# Altium integrated library Samtec 2 mm Pitch Terminal Strips.IntLib: 623 symbols (part 5 of 5) (continued)
## TW-24-05-L-D-340-110
designator P?
Through-Hole Board Stacker, Vertical, -55 to 125 degC, 2 mm Pitch, 48-Pin, Male, RoHS; Manufacturer: Samtec; PartNumber: TW-24-05-L-D-340-110; Pitch: 2 mm; DatasheetVersion: F-214; PackageVersion: BF, 6/1998; PackageReference: TW-24-05-X-D-340-110; PackageDescription: High Temp 2mm Terminal Strip(Board Stacking); Orientation: Vertical; RoHS: True; Temperature Range: -55 to 125 degC; Mounting Technology: Through-hole; ComponentLink1Description: Manufacturer URL; ComponentLink1URL: http://www.samtec.com; ComponentLink2Description: Datasheet; ComponentLink2URL: http://d2a072wq521u33.cloudfront.net/catalog_english//TW_TH.PDF; ComponentLink3Description: Package Specification; ComponentLink3URL: http://www.samtec.com/documents/webfiles/cpdf/TW-XX-XX-X-X-XXX-XXX-XXX-XX-MKT2.pdf
footprint SMTC-TW-24-05-X-D-340-110 (Terminal Strip, 2x24 Pins, Vertical, 2mm Pitch, Male)
pins: 1, 2, 3, 4, 5, 6, 7, 8, 9, 10, 11, 12, 13, 14, 15, 16, 17, 18, 19, 20, 21, 22, 23, 24, 25, 26, 27, 28, 29, 30, 31, 32, 33, 34, 35, 36, 37, 38, 39, 40, 41, 42, 43, 44, 45, 46, 47, 48

## TW-24-05-L-D-340-115
designator P?
Through-Hole Board Stacker, Vertical, -55 to 125 degC, 2 mm Pitch, 48-Pin, Male, RoHS; Manufacturer: Samtec; PartNumber: TW-24-05-L-D-340-115; Pitch: 2 mm; DatasheetVersion: F-214; PackageVersion: BF, 6/1998; PackageReference: TW-24-05-X-D-340-115; PackageDescription: High Temp 2mm Terminal Strip(Board Stacking); Orientation: Vertical; RoHS: True; Temperature Range: -55 to 125 degC; Mounting Technology: Through-hole; ComponentLink1Description: Manufacturer URL; ComponentLink1URL: http://www.samtec.com; ComponentLink2Description: Datasheet; ComponentLink2URL: http://d2a072wq521u33.cloudfront.net/catalog_english//TW_TH.PDF; ComponentLink3Description: Package Specification; ComponentLink3URL: http://www.samtec.com/documents/webfiles/cpdf/TW-XX-XX-X-X-XXX-XXX-XXX-XX-MKT2.pdf
footprint SMTC-TW-24-05-X-D-340-115 (Terminal Strip, 2x24 Pins, Vertical, 2mm Pitch, Male)
pins: 1, 2, 3, 4, 5, 6, 7, 8, 9, 10, 11, 12, 13, 14, 15, 16, 17, 18, 19, 20, 21, 22, 23, 24, 25, 26, 27, 28, 29, 30, 31, 32, 33, 34, 35, 36, 37, 38, 39, 40, 41, 42, 43, 44, 45, 46, 47, 48

## TW-24-05-T-D-340-110
designator P?
Through-Hole Board Stacker, Vertical, -55 to 105 degC, 2 mm Pitch, 48-Pin, Male, RoHS; Manufacturer: Samtec; PartNumber: TW-24-05-T-D-340-110; Pitch: 2 mm; DatasheetVersion: F-214; PackageVersion: BF, 6/1998; PackageReference: TW-24-05-X-D-340-110; PackageDescription: High Temp 2mm Terminal Strip(Board Stacking); Orientation: Vertical; RoHS: True; Temperature Range: -55 to 105 degC; Mounting Technology: Through-hole; ComponentLink1Description: Manufacturer URL; ComponentLink1URL: http://www.samtec.com; ComponentLink2Description: Datasheet; ComponentLink2URL: http://d2a072wq521u33.cloudfront.net/catalog_english//TW_TH.PDF; ComponentLink3Description: Package Specification; ComponentLink3URL: http://www.samtec.com/documents/webfiles/cpdf/TW-XX-XX-X-X-XXX-XXX-XXX-XX-MKT2.pdf
footprint SMTC-TW-24-05-X-D-340-110 (Terminal Strip, 2x24 Pins, Vertical, 2mm Pitch, Male)
pins: 1, 2, 3, 4, 5, 6, 7, 8, 9, 10, 11, 12, 13, 14, 15, 16, 17, 18, 19, 20, 21, 22, 23, 24, 25, 26, 27, 28, 29, 30, 31, 32, 33, 34, 35, 36, 37, 38, 39, 40, 41, 42, 43, 44, 45, 46, 47, 48

## TW-24-05-T-D-340-115
designator P?
Through-Hole Board Stacker, Vertical, -55 to 105 degC, 2 mm Pitch, 48-Pin, Male, RoHS; Manufacturer: Samtec; PartNumber: TW-24-05-T-D-340-115; Pitch: 2 mm; DatasheetVersion: F-214; PackageVersion: BF, 6/1998; PackageReference: TW-24-05-X-D-340-115; PackageDescription: High Temp 2mm Terminal Strip(Board Stacking); Orientation: Vertical; RoHS: True; Temperature Range: -55 to 105 degC; Mounting Technology: Through-hole; ComponentLink1Description: Manufacturer URL; ComponentLink1URL: http://www.samtec.com; ComponentLink2Description: Datasheet; ComponentLink2URL: http://d2a072wq521u33.cloudfront.net/catalog_english//TW_TH.PDF; ComponentLink3Description: Package Specification; ComponentLink3URL: http://www.samtec.com/documents/webfiles/cpdf/TW-XX-XX-X-X-XXX-XXX-XXX-XX-MKT2.pdf
footprint SMTC-TW-24-05-X-D-340-115 (Terminal Strip, 2x24 Pins, Vertical, 2mm Pitch, Male)
pins: 1, 2, 3, 4, 5, 6, 7, 8, 9, 10, 11, 12, 13, 14, 15, 16, 17, 18, 19, 20, 21, 22, 23, 24, 25, 26, 27, 28, 29, 30, 31, 32, 33, 34, 35, 36, 37, 38, 39, 40, 41, 42, 43, 44, 45, 46, 47, 48

## TW-25-03-F-D-200-170
designator P?
Through-Hole Board Stacker, Vertical, -55 to 125 degC, 2 mm Pitch, 50-Pin, Male, RoHS; Manufacturer: Samtec; PartNumber: TW-25-03-F-D-200-170; Pitch: 2 mm; DatasheetVersion: F-214; PackageVersion: BF, 6/1998; PackageReference: TW-25-03-X-D-200-170; PackageDescription: High Temp 2mm Terminal Strip(Board Stacking); Orientation: Vertical; RoHS: True; Temperature Range: -55 to 125 degC; Mounting Technology: Through-hole; ComponentLink1Description: Manufacturer URL; ComponentLink1URL: http://www.samtec.com; ComponentLink2Description: Datasheet; ComponentLink2URL: http://d2a072wq521u33.cloudfront.net/catalog_english//TW_TH.PDF; ComponentLink3Description: Package Specification; ComponentLink3URL: http://www.samtec.com/documents/webfiles/cpdf/TW-XX-XX-X-X-XXX-XXX-XXX-XX-MKT2.pdf
footprint SMTC-TW-25-03-X-D-200-170 (Terminal Strip, 2x25 Pins, Vertical, 2mm Pitch, Male)
pins: 1, 2, 3, 4, 5, 6, 7, 8, 9, 10, 11, 12, 13, 14, 15, 16, 17, 18, 19, 20, 21, 22, 23, 24, 25, 26, 27, 28, 29, 30, 31, 32, 33, 34, 35, 36, 37, 38, 39, 40, 41, 42, 43, 44, 45, 46, 47, 48, 49, 50

## TW-25-03-F-D-250-150
designator P?
Through-Hole Board Stacker, Vertical, -55 to 125 degC, 2 mm Pitch, 50-Pin, Male, RoHS; Manufacturer: Samtec; PartNumber: TW-25-03-F-D-250-150; Pitch: 2 mm; DatasheetVersion: F-214; PackageVersion: BF, 6/1998; PackageReference: TW-25-03-X-D-250-150; PackageDescription: High Temp 2mm Terminal Strip(Board Stacking); Orientation: Vertical; RoHS: True; Temperature Range: -55 to 125 degC; Mounting Technology: Through-hole; ComponentLink1Description: Manufacturer URL; ComponentLink1URL: http://www.samtec.com; ComponentLink2Description: Datasheet; ComponentLink2URL: http://d2a072wq521u33.cloudfront.net/catalog_english//TW_TH.PDF; ComponentLink3Description: Package Specification; ComponentLink3URL: http://www.samtec.com/documents/webfiles/cpdf/TW-XX-XX-X-X-XXX-XXX-XXX-XX-MKT2.pdf
footprint SMTC-TW-25-03-X-D-250-150 (Terminal Strip, 2x25 Pins, Vertical, 2mm Pitch, Male)
pins: 1, 2, 3, 4, 5, 6, 7, 8, 9, 10, 11, 12, 13, 14, 15, 16, 17, 18, 19, 20, 21, 22, 23, 24, 25, 26, 27, 28, 29, 30, 31, 32, 33, 34, 35, 36, 37, 38, 39, 40, 41, 42, 43, 44, 45, 46, 47, 48, 49, 50

## TW-25-03-L-D-200-170
designator P?
Through-Hole Board Stacker, Vertical, -55 to 125 degC, 2 mm Pitch, 50-Pin, Male, RoHS; Manufacturer: Samtec; PartNumber: TW-25-03-L-D-200-170; Pitch: 2 mm; DatasheetVersion: F-214; PackageVersion: BF, 6/1998; PackageReference: TW-25-03-X-D-200-170; PackageDescription: High Temp 2mm Terminal Strip(Board Stacking); Orientation: Vertical; RoHS: True; Temperature Range: -55 to 125 degC; Mounting Technology: Through-hole; ComponentLink1Description: Manufacturer URL; ComponentLink1URL: http://www.samtec.com; ComponentLink2Description: Datasheet; ComponentLink2URL: http://d2a072wq521u33.cloudfront.net/catalog_english//TW_TH.PDF; ComponentLink3Description: Package Specification; ComponentLink3URL: http://www.samtec.com/documents/webfiles/cpdf/TW-XX-XX-X-X-XXX-XXX-XXX-XX-MKT2.pdf
footprint SMTC-TW-25-03-X-D-200-170 (Terminal Strip, 2x25 Pins, Vertical, 2mm Pitch, Male)
pins: 1, 2, 3, 4, 5, 6, 7, 8, 9, 10, 11, 12, 13, 14, 15, 16, 17, 18, 19, 20, 21, 22, 23, 24, 25, 26, 27, 28, 29, 30, 31, 32, 33, 34, 35, 36, 37, 38, 39, 40, 41, 42, 43, 44, 45, 46, 47, 48, 49, 50

## TW-25-03-L-D-250-150
designator P?
Through-Hole Board Stacker, Vertical, -55 to 125 degC, 2 mm Pitch, 50-Pin, Male, RoHS; Manufacturer: Samtec; PartNumber: TW-25-03-L-D-250-150; Pitch: 2 mm; DatasheetVersion: F-214; PackageVersion: BF, 6/1998; PackageReference: TW-25-03-X-D-250-150; PackageDescription: High Temp 2mm Terminal Strip(Board Stacking); Orientation: Vertical; RoHS: True; Temperature Range: -55 to 125 degC; Mounting Technology: Through-hole; ComponentLink1Description: Manufacturer URL; ComponentLink1URL: http://www.samtec.com; ComponentLink2Description: Datasheet; ComponentLink2URL: http://d2a072wq521u33.cloudfront.net/catalog_english//TW_TH.PDF; ComponentLink3Description: Package Specification; ComponentLink3URL: http://www.samtec.com/documents/webfiles/cpdf/TW-XX-XX-X-X-XXX-XXX-XXX-XX-MKT2.pdf
footprint SMTC-TW-25-03-X-D-250-150 (Terminal Strip, 2x25 Pins, Vertical, 2mm Pitch, Male)
pins: 1, 2, 3, 4, 5, 6, 7, 8, 9, 10, 11, 12, 13, 14, 15, 16, 17, 18, 19, 20, 21, 22, 23, 24, 25, 26, 27, 28, 29, 30, 31, 32, 33, 34, 35, 36, 37, 38, 39, 40, 41, 42, 43, 44, 45, 46, 47, 48, 49, 50

## TW-25-03-T-D-200-170
designator P?
Through-Hole Board Stacker, Vertical, -55 to 105 degC, 2 mm Pitch, 50-Pin, Male, RoHS; Manufacturer: Samtec; PartNumber: TW-25-03-T-D-200-170; Pitch: 2 mm; DatasheetVersion: F-214; PackageVersion: BF, 6/1998; PackageReference: TW-25-03-X-D-200-170; PackageDescription: High Temp 2mm Terminal Strip(Board Stacking); Orientation: Vertical; RoHS: True; Temperature Range: -55 to 105 degC; Mounting Technology: Through-hole; ComponentLink1Description: Manufacturer URL; ComponentLink1URL: http://www.samtec.com; ComponentLink2Description: Datasheet; ComponentLink2URL: http://d2a072wq521u33.cloudfront.net/catalog_english//TW_TH.PDF; ComponentLink3Description: Package Specification; ComponentLink3URL: http://www.samtec.com/documents/webfiles/cpdf/TW-XX-XX-X-X-XXX-XXX-XXX-XX-MKT2.pdf
footprint SMTC-TW-25-03-X-D-200-170 (Terminal Strip, 2x25 Pins, Vertical, 2mm Pitch, Male)
pins: 1, 2, 3, 4, 5, 6, 7, 8, 9, 10, 11, 12, 13, 14, 15, 16, 17, 18, 19, 20, 21, 22, 23, 24, 25, 26, 27, 28, 29, 30, 31, 32, 33, 34, 35, 36, 37, 38, 39, 40, 41, 42, 43, 44, 45, 46, 47, 48, 49, 50

## TW-25-03-T-D-250-150
designator P?
Through-Hole Board Stacker, Vertical, -55 to 105 degC, 2 mm Pitch, 50-Pin, Male, RoHS; Manufacturer: Samtec; PartNumber: TW-25-03-T-D-250-150; Pitch: 2 mm; DatasheetVersion: F-214; PackageVersion: BF, 6/1998; PackageReference: TW-25-03-X-D-250-150; PackageDescription: High Temp 2mm Terminal Strip(Board Stacking); Orientation: Vertical; RoHS: True; Temperature Range: -55 to 105 degC; Mounting Technology: Through-hole; ComponentLink1Description: Manufacturer URL; ComponentLink1URL: http://www.samtec.com; ComponentLink2Description: Datasheet; ComponentLink2URL: http://d2a072wq521u33.cloudfront.net/catalog_english//TW_TH.PDF; ComponentLink3Description: Package Specification; ComponentLink3URL: http://www.samtec.com/documents/webfiles/cpdf/TW-XX-XX-X-X-XXX-XXX-XXX-XX-MKT2.pdf
footprint SMTC-TW-25-03-X-D-250-150 (Terminal Strip, 2x25 Pins, Vertical, 2mm Pitch, Male)
pins: 1, 2, 3, 4, 5, 6, 7, 8, 9, 10, 11, 12, 13, 14, 15, 16, 17, 18, 19, 20, 21, 22, 23, 24, 25, 26, 27, 28, 29, 30, 31, 32, 33, 34, 35, 36, 37, 38, 39, 40, 41, 42, 43, 44, 45, 46, 47, 48, 49, 50

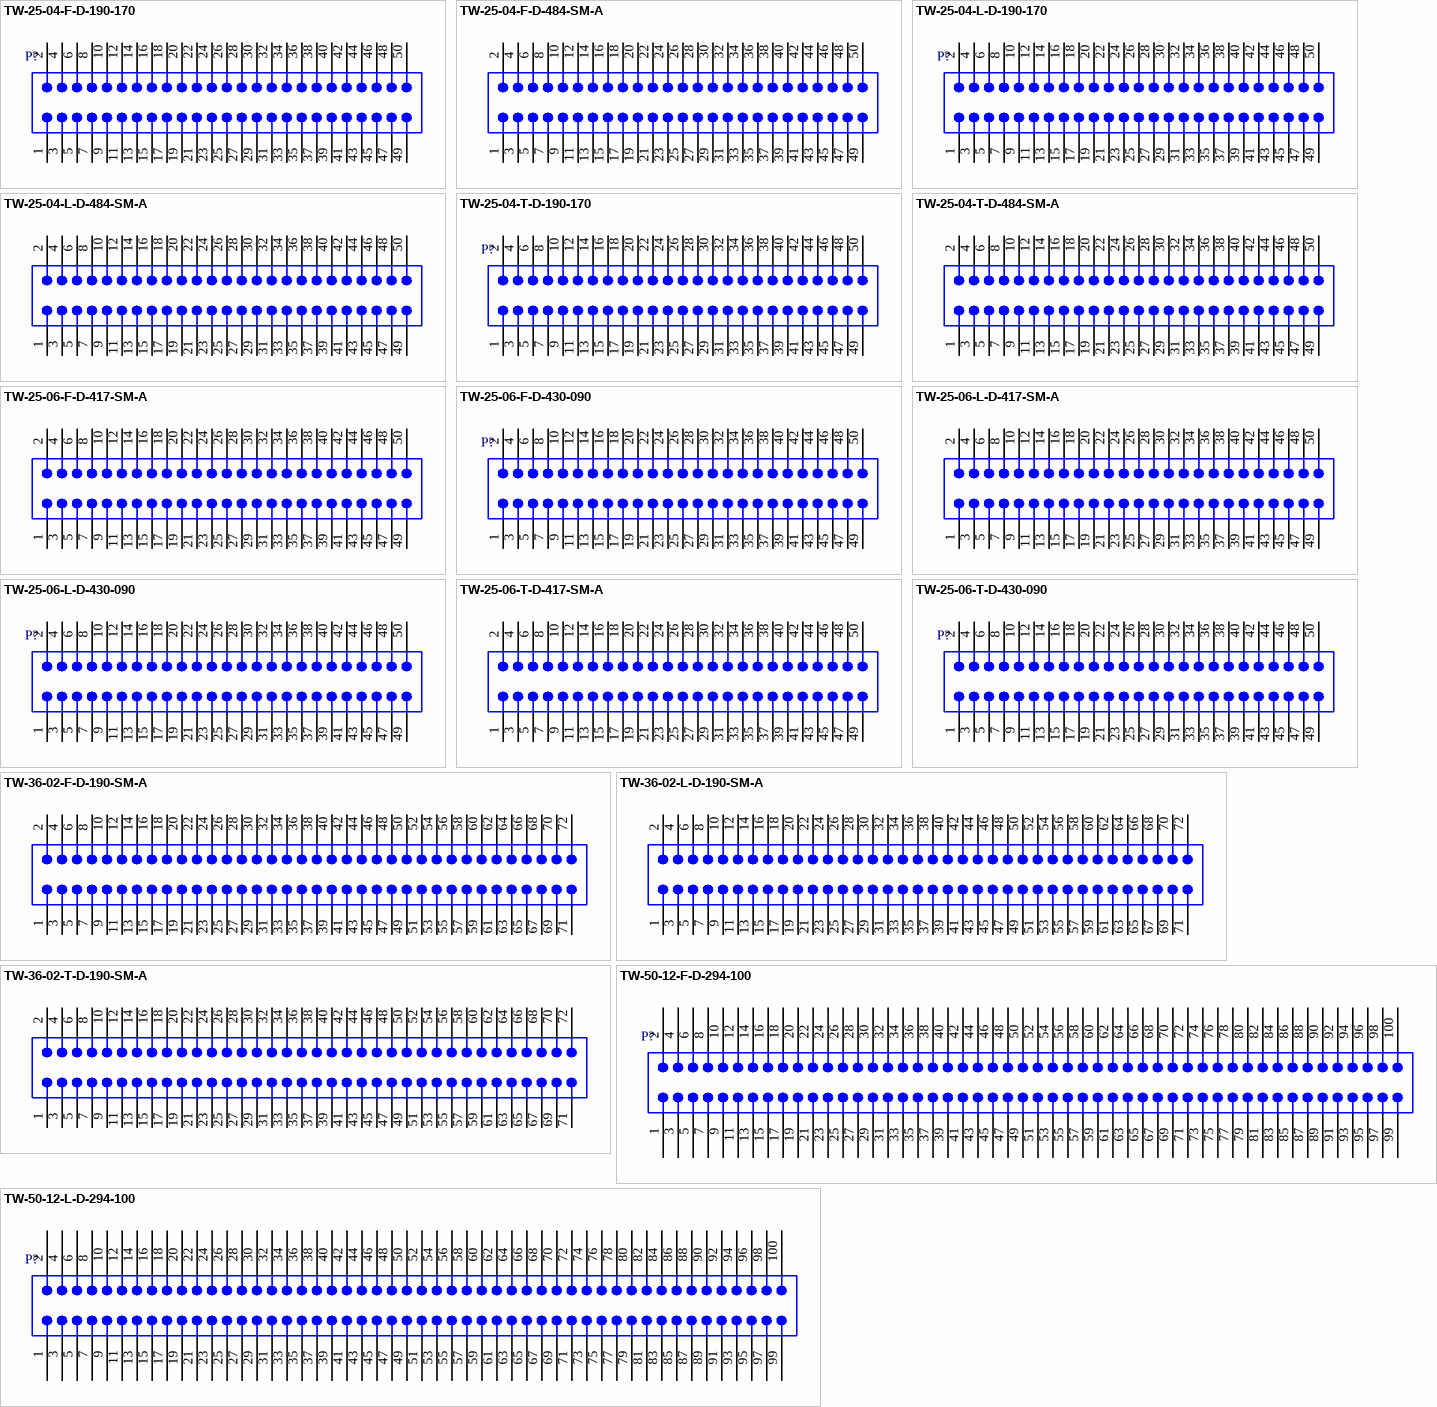
[diagram p16: symbols TW-25-04-F-D-190-170 to TW-50-12-L-D-294-100]

## TW-25-04-F-D-190-170
designator P?
Through-Hole Board Stacker, Vertical, -55 to 125 degC, 2 mm Pitch, 50-Pin, Male, RoHS; Manufacturer: Samtec; PartNumber: TW-25-04-F-D-190-170; Pitch: 2 mm; DatasheetVersion: F-214; PackageVersion: BF, 6/1998; PackageReference: TW-25-04-X-D-190-170; PackageDescription: High Temp 2mm Terminal Strip(Board Stacking); Orientation: Vertical; RoHS: True; Temperature Range: -55 to 125 degC; Mounting Technology: Through-hole; ComponentLink1Description: Manufacturer URL; ComponentLink1URL: http://www.samtec.com; ComponentLink2Description: Datasheet; ComponentLink2URL: http://d2a072wq521u33.cloudfront.net/catalog_english//TW_TH.PDF; ComponentLink3Description: Package Specification; ComponentLink3URL: http://www.samtec.com/documents/webfiles/cpdf/TW-XX-XX-X-X-XXX-XXX-XXX-XX-MKT2.pdf
footprint SMTC-TW-25-04-X-D-190-170 (Terminal Strip, 2x25 Pins, Vertical, 2mm Pitch, Male)
pins: 1, 2, 3, 4, 5, 6, 7, 8, 9, 10, 11, 12, 13, 14, 15, 16, 17, 18, 19, 20, 21, 22, 23, 24, 25, 26, 27, 28, 29, 30, 31, 32, 33, 34, 35, 36, 37, 38, 39, 40, 41, 42, 43, 44, 45, 46, 47, 48, 49, 50

## TW-25-04-F-D-484-SM-A
designator ?
SMT Board Stacker, Vertical, -55 to 125 degC, 2 mm Pitch, 50-Pin, Male, RoHS; Manufacturer: Samtec; PartNumber: TW-25-04-F-D-484-SM-A; Pitch: 2 mm; DatasheetVersion: F-214; PackageVersion: CL, 3/1993; PackageReference: TW-25-04-X-D-484-SM-A; PackageDescription: High Temp 2mm SMT Board Stacking Terminal Strip ASM; Orientation: Vertical; RoHS: True; Temperature Range: -55 to 125 degC; Mounting Technology: Surface Mount; ComponentLink1Description: Manufacturer URL; ComponentLink1URL: http://www.samtec.com; ComponentLink2Description: Datasheet; ComponentLink2URL: http://d2a072wq521u33.cloudfront.net/catalog_english//TW_SM.PDF; ComponentLink3Description: Package Specification; ComponentLink3URL: http://www.samtec.com/documents/webfiles/cpdf/TW-XX-XX-XXX-X-XXX-SM-XXX-XX-MKT1.pdf
footprint SMTC-TW-25-04-X-D-484-SM-A (SMT Board Stacking Terminal Strip ASM, 2x25 Pins, Vertical, 2mm Pitch, Male)
pins: 1, 2, 3, 4, 5, 6, 7, 8, 9, 10, 11, 12, 13, 14, 15, 16, 17, 18, 19, 20, 21, 22, 23, 24, 25, 26, 27, 28, 29, 30, 31, 32, 33, 34, 35, 36, 37, 38, 39, 40, 41, 42, 43, 44, 45, 46, 47, 48, 49, 50

## TW-25-04-L-D-190-170
designator P?
Through-Hole Board Stacker, Vertical, -55 to 125 degC, 2 mm Pitch, 50-Pin, Male, RoHS; Manufacturer: Samtec; PartNumber: TW-25-04-L-D-190-170; Pitch: 2 mm; DatasheetVersion: F-214; PackageVersion: BF, 6/1998; PackageReference: TW-25-04-X-D-190-170; PackageDescription: High Temp 2mm Terminal Strip(Board Stacking); Orientation: Vertical; RoHS: True; Temperature Range: -55 to 125 degC; Mounting Technology: Through-hole; ComponentLink1Description: Manufacturer URL; ComponentLink1URL: http://www.samtec.com; ComponentLink2Description: Datasheet; ComponentLink2URL: http://d2a072wq521u33.cloudfront.net/catalog_english//TW_TH.PDF; ComponentLink3Description: Package Specification; ComponentLink3URL: http://www.samtec.com/documents/webfiles/cpdf/TW-XX-XX-X-X-XXX-XXX-XXX-XX-MKT2.pdf
footprint SMTC-TW-25-04-X-D-190-170 (Terminal Strip, 2x25 Pins, Vertical, 2mm Pitch, Male)
pins: 1, 2, 3, 4, 5, 6, 7, 8, 9, 10, 11, 12, 13, 14, 15, 16, 17, 18, 19, 20, 21, 22, 23, 24, 25, 26, 27, 28, 29, 30, 31, 32, 33, 34, 35, 36, 37, 38, 39, 40, 41, 42, 43, 44, 45, 46, 47, 48, 49, 50

## TW-25-04-L-D-484-SM-A
designator ?
SMT Board Stacker, Vertical, -55 to 125 degC, 2 mm Pitch, 50-Pin, Male, RoHS; Manufacturer: Samtec; PartNumber: TW-25-04-L-D-484-SM-A; Pitch: 2 mm; DatasheetVersion: F-214; PackageVersion: CL, 3/1993; PackageReference: TW-25-04-X-D-484-SM-A; PackageDescription: High Temp 2mm SMT Board Stacking Terminal Strip ASM; Orientation: Vertical; RoHS: True; Temperature Range: -55 to 125 degC; Mounting Technology: Surface Mount; ComponentLink1Description: Manufacturer URL; ComponentLink1URL: http://www.samtec.com; ComponentLink2Description: Datasheet; ComponentLink2URL: http://d2a072wq521u33.cloudfront.net/catalog_english//TW_SM.PDF; ComponentLink3Description: Package Specification; ComponentLink3URL: http://www.samtec.com/documents/webfiles/cpdf/TW-XX-XX-XXX-X-XXX-SM-XXX-XX-MKT1.pdf
footprint SMTC-TW-25-04-X-D-484-SM-A (SMT Board Stacking Terminal Strip ASM, 2x25 Pins, Vertical, 2mm Pitch, Male)
pins: 1, 2, 3, 4, 5, 6, 7, 8, 9, 10, 11, 12, 13, 14, 15, 16, 17, 18, 19, 20, 21, 22, 23, 24, 25, 26, 27, 28, 29, 30, 31, 32, 33, 34, 35, 36, 37, 38, 39, 40, 41, 42, 43, 44, 45, 46, 47, 48, 49, 50

## TW-25-04-T-D-190-170
designator P?
Through-Hole Board Stacker, Vertical, -55 to 105 degC, 2 mm Pitch, 50-Pin, Male, RoHS; Manufacturer: Samtec; PartNumber: TW-25-04-T-D-190-170; Pitch: 2 mm; DatasheetVersion: F-214; PackageVersion: BF, 6/1998; PackageReference: TW-25-04-X-D-190-170; PackageDescription: High Temp 2mm Terminal Strip(Board Stacking); Orientation: Vertical; RoHS: True; Temperature Range: -55 to 105 degC; Mounting Technology: Through-hole; ComponentLink1Description: Manufacturer URL; ComponentLink1URL: http://www.samtec.com; ComponentLink2Description: Datasheet; ComponentLink2URL: http://d2a072wq521u33.cloudfront.net/catalog_english//TW_TH.PDF; ComponentLink3Description: Package Specification; ComponentLink3URL: http://www.samtec.com/documents/webfiles/cpdf/TW-XX-XX-X-X-XXX-XXX-XXX-XX-MKT2.pdf
footprint SMTC-TW-25-04-X-D-190-170 (Terminal Strip, 2x25 Pins, Vertical, 2mm Pitch, Male)
pins: 1, 2, 3, 4, 5, 6, 7, 8, 9, 10, 11, 12, 13, 14, 15, 16, 17, 18, 19, 20, 21, 22, 23, 24, 25, 26, 27, 28, 29, 30, 31, 32, 33, 34, 35, 36, 37, 38, 39, 40, 41, 42, 43, 44, 45, 46, 47, 48, 49, 50

## TW-25-04-T-D-484-SM-A
designator ?
SMT Board Stacker, Vertical, -55 to 105 degC, 2 mm Pitch, 50-Pin, Male, RoHS; Manufacturer: Samtec; PartNumber: TW-25-04-T-D-484-SM-A; Pitch: 2 mm; DatasheetVersion: F-214; PackageVersion: CL, 3/1993; PackageReference: TW-25-04-X-D-484-SM-A; PackageDescription: High Temp 2mm SMT Board Stacking Terminal Strip ASM; Orientation: Vertical; RoHS: True; Temperature Range: -55 to 105 degC; Mounting Technology: Surface Mount; ComponentLink1Description: Manufacturer URL; ComponentLink1URL: http://www.samtec.com; ComponentLink2Description: Datasheet; ComponentLink2URL: http://d2a072wq521u33.cloudfront.net/catalog_english//TW_SM.PDF; ComponentLink3Description: Package Specification; ComponentLink3URL: http://www.samtec.com/documents/webfiles/cpdf/TW-XX-XX-XXX-X-XXX-SM-XXX-XX-MKT1.pdf
footprint SMTC-TW-25-04-X-D-484-SM-A (SMT Board Stacking Terminal Strip ASM, 2x25 Pins, Vertical, 2mm Pitch, Male)
pins: 1, 2, 3, 4, 5, 6, 7, 8, 9, 10, 11, 12, 13, 14, 15, 16, 17, 18, 19, 20, 21, 22, 23, 24, 25, 26, 27, 28, 29, 30, 31, 32, 33, 34, 35, 36, 37, 38, 39, 40, 41, 42, 43, 44, 45, 46, 47, 48, 49, 50

## TW-25-06-F-D-417-SM-A
designator ?
SMT Board Stacker, Vertical, -55 to 125 degC, 2 mm Pitch, 50-Pin, Male, RoHS; Manufacturer: Samtec; PartNumber: TW-25-06-F-D-417-SM-A; Pitch: 2 mm; DatasheetVersion: F-214; PackageVersion: CL, 3/1993; PackageReference: TW-25-06-X-D-417-SM-A; PackageDescription: High Temp 2mm SMT Board Stacking Terminal Strip ASM; Orientation: Vertical; RoHS: True; Temperature Range: -55 to 125 degC; Mounting Technology: Surface Mount; ComponentLink1Description: Manufacturer URL; ComponentLink1URL: http://www.samtec.com; ComponentLink2Description: Datasheet; ComponentLink2URL: http://d2a072wq521u33.cloudfront.net/catalog_english//TW_SM.PDF; ComponentLink3Description: Package Specification; ComponentLink3URL: http://www.samtec.com/documents/webfiles/cpdf/TW-XX-XX-XXX-X-XXX-SM-XXX-XX-MKT1.pdf
footprint SMTC-TW-25-06-X-D-417-SM-A (SMT Board Stacking Terminal Strip ASM, 2x25 Pins, Vertical, 2mm Pitch, Male)
pins: 1, 2, 3, 4, 5, 6, 7, 8, 9, 10, 11, 12, 13, 14, 15, 16, 17, 18, 19, 20, 21, 22, 23, 24, 25, 26, 27, 28, 29, 30, 31, 32, 33, 34, 35, 36, 37, 38, 39, 40, 41, 42, 43, 44, 45, 46, 47, 48, 49, 50

## TW-25-06-F-D-430-090
designator P?
Through-Hole Board Stacker, Vertical, -55 to 125 degC, 2 mm Pitch, 50-Pin, Male, RoHS; Manufacturer: Samtec; PartNumber: TW-25-06-F-D-430-090; Pitch: 2 mm; DatasheetVersion: F-214; PackageVersion: BF, 6/1998; PackageReference: TW-25-06-X-D-430-090; PackageDescription: High Temp 2mm Terminal Strip(Board Stacking); Orientation: Vertical; RoHS: True; Temperature Range: -55 to 125 degC; Mounting Technology: Through-hole; ComponentLink1Description: Manufacturer URL; ComponentLink1URL: http://www.samtec.com; ComponentLink2Description: Datasheet; ComponentLink2URL: http://d2a072wq521u33.cloudfront.net/catalog_english//TW_TH.PDF; ComponentLink3Description: Package Specification; ComponentLink3URL: http://www.samtec.com/documents/webfiles/cpdf/TW-XX-XX-X-X-XXX-XXX-XXX-XX-MKT2.pdf
footprint SMTC-TW-25-06-X-D-430-090 (Terminal Strip, 2x25 Pins, Vertical, 2mm Pitch, Male)
pins: 1, 2, 3, 4, 5, 6, 7, 8, 9, 10, 11, 12, 13, 14, 15, 16, 17, 18, 19, 20, 21, 22, 23, 24, 25, 26, 27, 28, 29, 30, 31, 32, 33, 34, 35, 36, 37, 38, 39, 40, 41, 42, 43, 44, 45, 46, 47, 48, 49, 50

## TW-25-06-L-D-417-SM-A
designator ?
SMT Board Stacker, Vertical, -55 to 125 degC, 2 mm Pitch, 50-Pin, Male, RoHS; Manufacturer: Samtec; PartNumber: TW-25-06-L-D-417-SM-A; Pitch: 2 mm; DatasheetVersion: F-214; PackageVersion: CL, 3/1993; PackageReference: TW-25-06-X-D-417-SM-A; PackageDescription: High Temp 2mm SMT Board Stacking Terminal Strip ASM; Orientation: Vertical; RoHS: True; Temperature Range: -55 to 125 degC; Mounting Technology: Surface Mount; ComponentLink1Description: Manufacturer URL; ComponentLink1URL: http://www.samtec.com; ComponentLink2Description: Datasheet; ComponentLink2URL: http://d2a072wq521u33.cloudfront.net/catalog_english//TW_SM.PDF; ComponentLink3Description: Package Specification; ComponentLink3URL: http://www.samtec.com/documents/webfiles/cpdf/TW-XX-XX-XXX-X-XXX-SM-XXX-XX-MKT1.pdf
footprint SMTC-TW-25-06-X-D-417-SM-A (SMT Board Stacking Terminal Strip ASM, 2x25 Pins, Vertical, 2mm Pitch, Male)
pins: 1, 2, 3, 4, 5, 6, 7, 8, 9, 10, 11, 12, 13, 14, 15, 16, 17, 18, 19, 20, 21, 22, 23, 24, 25, 26, 27, 28, 29, 30, 31, 32, 33, 34, 35, 36, 37, 38, 39, 40, 41, 42, 43, 44, 45, 46, 47, 48, 49, 50

## TW-25-06-L-D-430-090
designator P?
Through-Hole Board Stacker, Vertical, -55 to 125 degC, 2 mm Pitch, 50-Pin, Male, RoHS; Manufacturer: Samtec; PartNumber: TW-25-06-L-D-430-090; Pitch: 2 mm; DatasheetVersion: F-214; PackageVersion: BF, 6/1998; PackageReference: TW-25-06-X-D-430-090; PackageDescription: High Temp 2mm Terminal Strip(Board Stacking); Orientation: Vertical; RoHS: True; Temperature Range: -55 to 125 degC; Mounting Technology: Through-hole; ComponentLink1Description: Manufacturer URL; ComponentLink1URL: http://www.samtec.com; ComponentLink2Description: Datasheet; ComponentLink2URL: http://d2a072wq521u33.cloudfront.net/catalog_english//TW_TH.PDF; ComponentLink3Description: Package Specification; ComponentLink3URL: http://www.samtec.com/documents/webfiles/cpdf/TW-XX-XX-X-X-XXX-XXX-XXX-XX-MKT2.pdf
footprint SMTC-TW-25-06-X-D-430-090 (Terminal Strip, 2x25 Pins, Vertical, 2mm Pitch, Male)
pins: 1, 2, 3, 4, 5, 6, 7, 8, 9, 10, 11, 12, 13, 14, 15, 16, 17, 18, 19, 20, 21, 22, 23, 24, 25, 26, 27, 28, 29, 30, 31, 32, 33, 34, 35, 36, 37, 38, 39, 40, 41, 42, 43, 44, 45, 46, 47, 48, 49, 50

## TW-25-06-T-D-417-SM-A
designator ?
SMT Board Stacker, Vertical, -55 to 105 degC, 2 mm Pitch, 50-Pin, Male, RoHS; Manufacturer: Samtec; PartNumber: TW-25-06-T-D-417-SM-A; Pitch: 2 mm; DatasheetVersion: F-214; PackageVersion: CL, 3/1993; PackageReference: TW-25-06-X-D-417-SM-A; PackageDescription: High Temp 2mm SMT Board Stacking Terminal Strip ASM; Orientation: Vertical; RoHS: True; Temperature Range: -55 to 105 degC; Mounting Technology: Surface Mount; ComponentLink1Description: Manufacturer URL; ComponentLink1URL: http://www.samtec.com; ComponentLink2Description: Datasheet; ComponentLink2URL: http://d2a072wq521u33.cloudfront.net/catalog_english//TW_SM.PDF; ComponentLink3Description: Package Specification; ComponentLink3URL: http://www.samtec.com/documents/webfiles/cpdf/TW-XX-XX-XXX-X-XXX-SM-XXX-XX-MKT1.pdf
footprint SMTC-TW-25-06-X-D-417-SM-A (SMT Board Stacking Terminal Strip ASM, 2x25 Pins, Vertical, 2mm Pitch, Male)
pins: 1, 2, 3, 4, 5, 6, 7, 8, 9, 10, 11, 12, 13, 14, 15, 16, 17, 18, 19, 20, 21, 22, 23, 24, 25, 26, 27, 28, 29, 30, 31, 32, 33, 34, 35, 36, 37, 38, 39, 40, 41, 42, 43, 44, 45, 46, 47, 48, 49, 50

## TW-25-06-T-D-430-090
designator P?
Through-Hole Board Stacker, Vertical, -55 to 105 degC, 2 mm Pitch, 50-Pin, Male, RoHS; Manufacturer: Samtec; PartNumber: TW-25-06-T-D-430-090; Pitch: 2 mm; DatasheetVersion: F-214; PackageVersion: BF, 6/1998; PackageReference: TW-25-06-X-D-430-090; PackageDescription: High Temp 2mm Terminal Strip(Board Stacking); Orientation: Vertical; RoHS: True; Temperature Range: -55 to 105 degC; Mounting Technology: Through-hole; ComponentLink1Description: Manufacturer URL; ComponentLink1URL: http://www.samtec.com; ComponentLink2Description: Datasheet; ComponentLink2URL: http://d2a072wq521u33.cloudfront.net/catalog_english//TW_TH.PDF; ComponentLink3Description: Package Specification; ComponentLink3URL: http://www.samtec.com/documents/webfiles/cpdf/TW-XX-XX-X-X-XXX-XXX-XXX-XX-MKT2.pdf
footprint SMTC-TW-25-06-X-D-430-090 (Terminal Strip, 2x25 Pins, Vertical, 2mm Pitch, Male)
pins: 1, 2, 3, 4, 5, 6, 7, 8, 9, 10, 11, 12, 13, 14, 15, 16, 17, 18, 19, 20, 21, 22, 23, 24, 25, 26, 27, 28, 29, 30, 31, 32, 33, 34, 35, 36, 37, 38, 39, 40, 41, 42, 43, 44, 45, 46, 47, 48, 49, 50

## TW-36-02-F-D-190-SM-A
designator ?